# Altium footprint library Custom1.PcbLib: 554 footprints (part 34 of 35)
Each footprint in its own frame and in the unit in brackets; x right, y up, seen from the top. Pads: shape width x height; smd on the part's side, far side on the other; paste and mask are expansions set on the pad; w line width, h text height; cw(c..) or ccw(c..) is an arc to the next point about the centre after c.
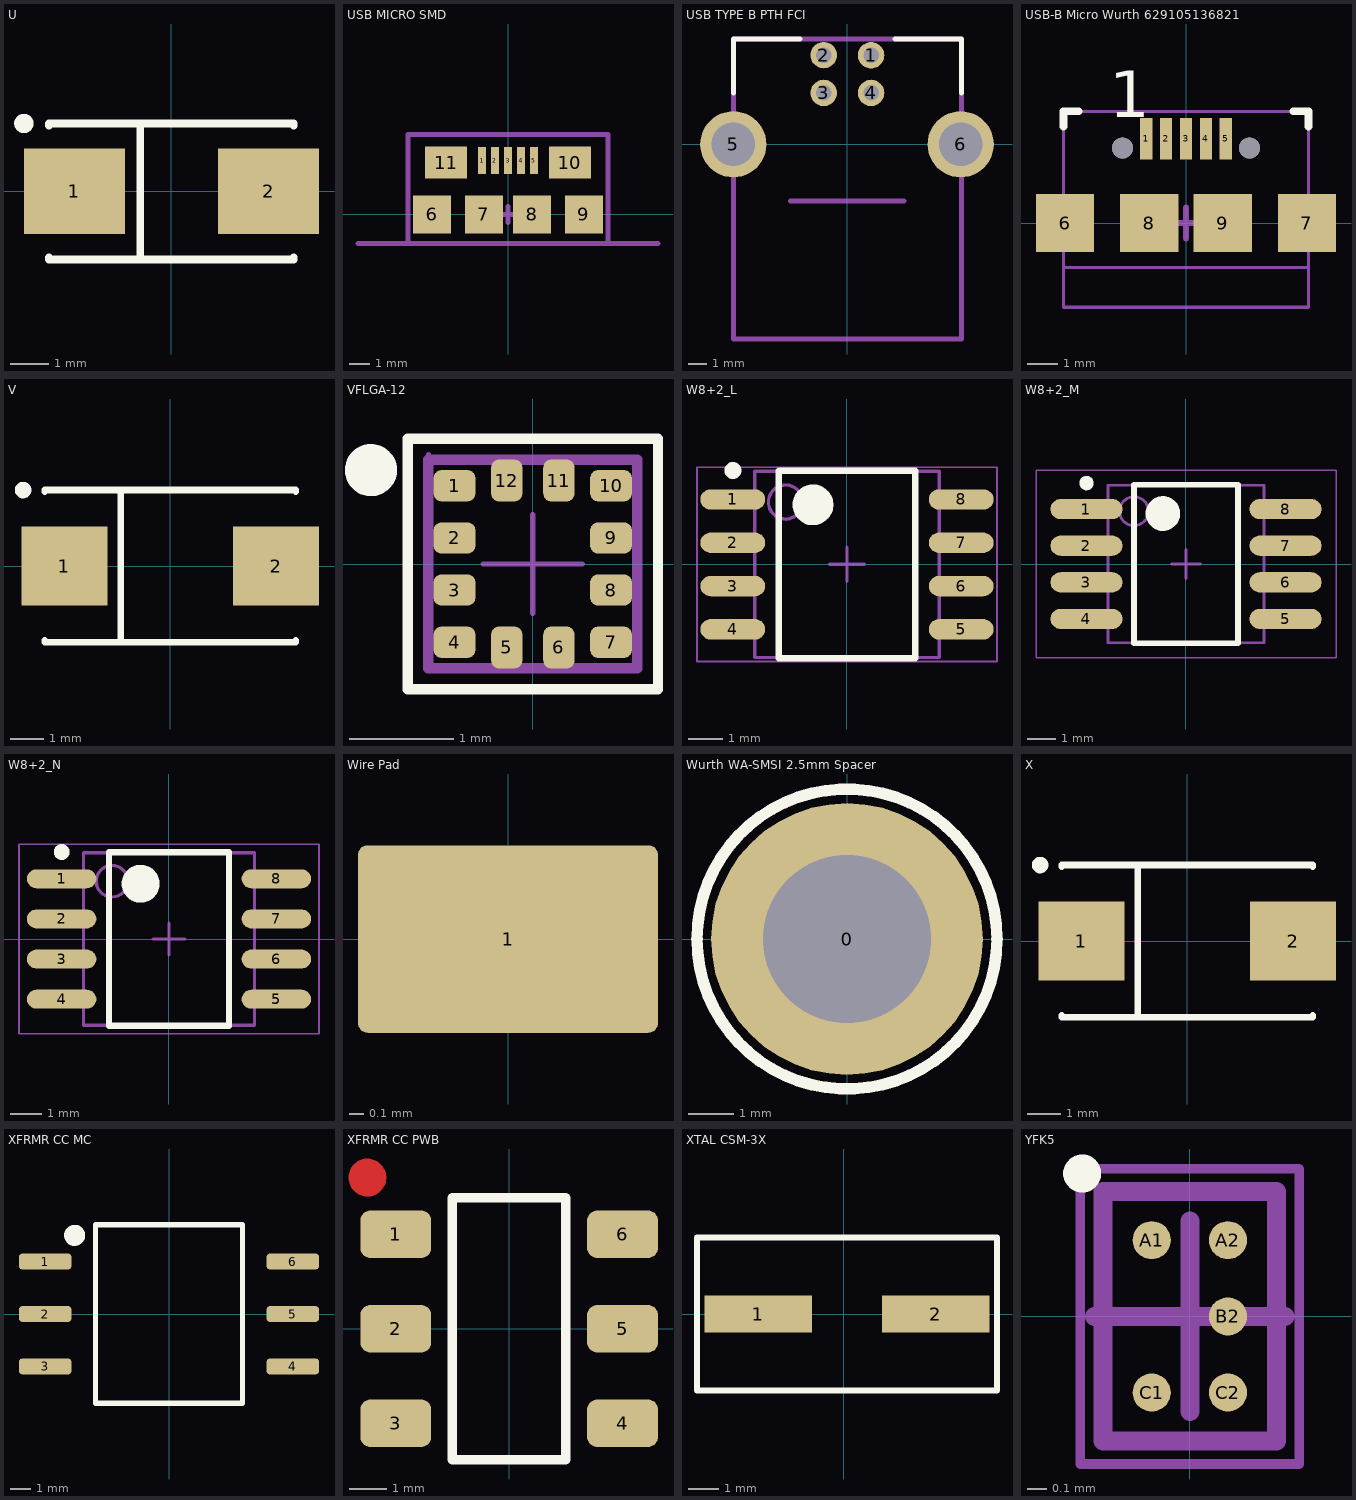
[diagram p33: the footprints below, top view; thin cyan lines are the x and y axes]

## U [mm] "Capacitor, SM Tantalum; Body 6.0 x 3.2 mm (LxW typ)"
height 1.5
pads (2):
  rect 2.6x2.2 smd: 1(-2.5,0) 2(2.5,0)
Top Overlay:
  circle w0.25: c-3.8,1.75 r0.125
  lines w0.2: -3.15,-1.7 -3.15,-1.75 3.15,-1.75 3.15,-1.7 ; -3.15,1.7 -3.15,1.75 3.15,1.75 3.15,1.7 ; -0.8,-1.75 -0.8,1.75

## USB MICRO SMD [mm]
pads (11):
  rect 0.4x1.35 smd: 1(-1.3,2.7) 2(-0.65,2.7) 3(0,2.7) 4(0.65,2.7) 5(1.3,2.7)
  rect 1.9x1.9 smd: 6(-3.8,0) 7(-1.2,0) 8(1.2,0) 9(3.8,0)
  rect 2.1x1.6 smd: 10(3.1,2.6) 11(-3.1,2.6)
Mechanical 15:
  lines w0.254: -7.5,-1.45 -3.2,-1.45 3.2,-1.45 7.5,-1.45 ; -5,-1.45 -5,4 5,4 5,-1.45 ; -0.4,0 0.4,0 ; 0,-0.4 0,0.4
3D body "10118192C.stp": height 2.69, standoff -0.32, extent -3.956,-2.7 3.956,2.96

## USB TYPE B PTH FCI [mm] "Type B USB Receptacle"
pads (6):
  round 1.4 hole 0.82: 1(1.25,4.7) 2(-1.25,4.71) 3(-1.25,2.71) 4(1.25,2.71)
  round 3.5 hole 2.3: 5(-6.02,0) 6(5.98,0)
Top Overlay:
  lines w0.254: -6.02,2.71 -6.02,5.56 -2.5,5.56 ; 2.5,5.56 6.02,5.56 6.02,2.71
Mechanical 15:
  lines w0.254: -3,-3 3,-3 ; -6.02,-10.28 -6.02,5.56 6.02,5.56 6.02,-10.28 -6.02,-10.28
3D body "USB Type B.STEP": height 11.01, standoff -2.78, extent -6.62,-10.17 6.5,5.77

## USB-B Micro Wurth 629105136821 [mm]
pads (11):
  rect 0.4x1.35 smd: 1(-1.3,2.75) 2(-0.65,2.75) 3(0,2.75) 4(0.65,2.75) 5(1.3,2.75)
  rect 1.9x1.9 smd: 6(-3.95,0) 7(3.95,0)
  rect 1.9x1.9 smd paste-1: 8(-1.2,0)
  rect 1.9x1.9 smd paste-1 mask+0.102: 9(1.2,0)
  round 0.69 hole 0.68 paste-0.1 mask+0: ""(-2.075,2.45) ""(2.075,2.45)
Top Overlay:
  lines w0.254: -4,3.15 -4,3.65 -3.5,3.65 ; 3.5,3.65 4,3.65 4,3.15
  text "1" at -2.5,3.45 h1.52
Mechanical 15:
  lines w0.1: -4,-1.45 4,-1.45 ; -4,-2.75 4,-2.75 4,3.65 -4,3.65 -4,-2.75
  lines w0.2: -0.5,0 0.5,0 ; 0,-0.5 0,0.5
  text "Overhang" at -2.7,-2.4 h0.7
3D body "629105136821.STEP": height 2.65, standoff -0.65, extent -4,-2.753 4,3.15

## V [mm] "Capacitor, SM Tantalum; Body 7.3 x 4.3 mm (LxW typ)"
height 2
pads (2):
  rect 2.6x2.4 smd: 1(-3.2,0) 2(3.2,0)
Top Overlay:
  circle w0.25: c-4.45,2.3 r0.125
  lines w0.2: -3.8,-2.25 -3.8,-2.3 3.8,-2.3 3.8,-2.25 ; -3.8,2.25 -3.8,2.3 3.8,2.3 3.8,2.25 ; -1.5,-2.3 -1.5,2.3

## VFLGA-12 [mm] "2.0 x 2.0 x 0.76 mm typ.)"
pads (12):
  rrect50% 0.4x0.3 smd mask+0.05: 1(-0.75,0.75) 2(-0.75,0.25) 3(-0.75,-0.25) 4(-0.75,-0.75) 7(0.75,-0.75) 8(0.75,-0.25) 9(0.75,0.25) 10(0.75,0.75)
  rrect50% 0.3x0.4 smd mask+0.05: 5(-0.25,-0.8) 6(0.25,-0.8) 11(0.25,0.8) 12(-0.25,0.8)
Top Overlay:
  circle w0.25: c-1.55,0.9 r0.125
  lines w0.1: -1.2,-1.2 1.2,-1.2 1.2,1.2 -1.2,1.2 -1.2,-1.2
Mechanical 13:
  lines w0.1: -1,-1 1,-1 1,1 -1,1 -1,-1
Mechanical 15:
  lines w0.05: -1,1 1,1 1,-1 -1,-1 -1,1.05 ; -0.475,0 0.475,0 ; 0,-0.475 0,0.475
3D body: height 1, standoff 0, extent -1.02,-1 0.98,1

## W8+2_L [mm] "SOP, 8-Leads, Body 5.3x5.3mm, Pitch 1.27mm, IPC High Density"
height 2.13
pads (8):
  oval 1.9x0.6 smd: 1(-3.35,1.905) 2(-3.35,0.635) 3(-3.35,-0.635) 4(-3.35,-1.905) 5(3.35,-1.905) 6(3.35,-0.635) 7(3.35,0.635) 8(3.35,1.905)
Top Overlay:
  circle w0.25: c-3.35,2.755 r0.125
  circle w0.6: c-1,1.75 r0.3
  lines w0.2: -2,-2.75 -2,2.75 2,2.75 2,-2.75 -2,-2.75
Mechanical 13:
  circle w0.1: c-1.805,1.83 r0.5
  lines w0.1: -2.705,-2.73 -2.705,2.73 2.705,2.73 2.705,-2.73 -2.705,-2.73
Mechanical 15:
  lines w0.05: -4.4,-2.85 -4.4,2.85 4.4,2.85 4.4,-2.85 -4.4,-2.85
  lines w0.1: -0.5,0 0.5,0 ; 0,-0.5 0,0.5
3D body: height 2.13, standoff 0.05, extent -2.705,-2.73 2.705,2.73

## W8+2_M [mm] "SOP, 8-Leads, Body 5.3x5.3mm, Pitch 1.27mm, IPC Low Density"
height 2.13
pads (8):
  oval 2.5x0.7 smd: 1(-3.45,1.905) 2(-3.45,0.635) 3(-3.45,-0.635) 4(-3.45,-1.905) 5(3.45,-1.905) 6(3.45,-0.635) 7(3.45,0.635) 8(3.45,1.905)
Top Overlay:
  circle w0.6: c-0.8,1.75 r0.3
  circle w0.25: c-3.45,2.805 r0.125
  lines w0.2: -1.8,-2.75 1.8,-2.75 1.8,2.75 -1.8,2.75 -1.8,-2.75
Mechanical 13:
  circle w0.1: c-1.805,1.83 r0.5
  lines w0.1: -2.705,-2.73 2.705,-2.73 2.705,2.73 -2.705,2.73 -2.705,-2.73
Mechanical 15:
  lines w0.05: -5.2,-3.25 5.2,-3.25 5.2,3.25 -5.2,3.25 -5.2,-3.25
  lines w0.1: -0.5,0 0.5,0 ; 0,-0.5 0,0.5
3D body: height 2.13, standoff 0.05, extent -2.705,-2.73 2.705,2.73

## W8+2_N [mm] "SOP, 8-Leads, Body 5.3x5.3mm, Pitch 1.27mm, IPC Medium Density"
height 2.13
pads (8):
  oval 2.2x0.6 smd: 1(-3.4,1.905) 2(-3.4,0.635) 3(-3.4,-0.635) 4(-3.4,-1.905) 5(3.4,-1.905) 6(3.4,-0.635) 7(3.4,0.635) 8(3.4,1.905)
Top Overlay:
  circle w0.25: c-3.4,2.755 r0.125
  circle w0.6: c-0.9,1.75 r0.3
  lines w0.2: -1.9,-2.75 -1.9,2.75 1.9,2.75 1.9,-2.75 -1.9,-2.75
Mechanical 13:
  circle w0.1: c-1.805,1.83 r0.5
  lines w0.1: -2.705,-2.73 -2.705,2.73 2.705,2.73 2.705,-2.73 -2.705,-2.73
Mechanical 15:
  lines w0.05: -4.75,-3 -4.75,3 4.75,3 4.75,-3 -4.75,-3
  lines w0.1: -0.5,0 0.5,0 ; 0,-0.5 0,0.5
3D body: height 2.13, standoff 0.05, extent -2.705,-2.73 2.705,2.73

## Wire Pad [mil] "50 x 80"
pads (1):
  rrect10% 80x50 smd: 1(0,0)
3D body: height 1, standoff 0, extent -75,-40 75,40

## Wurth WA-SMSI 2.5mm Spacer [mm] "9774065151"
pads (1):
  round 6 hole 3.7 paste-3: 0(0,0)
Top Overlay:
  circle w0.254: c0,0 r3.312
Top Paste:
  lines w0.85: -2.176,-1.23 cw(c0,0) -2.152,1.272 ; -1.323,-2.238 ccw(c0,0) 1.279,-2.263 ; -1.279,2.263 cw(c0,0) 1.323,2.238 ; -1.272,-2.152 ccw(c0,0) 1.23,-2.176 ; -1.23,2.176 cw(c0,0) 1.272,2.152 ; 2.152,-1.272 ccw(c0,0) 2.176,1.23 ; 2.238,-1.323 ccw(c0,0) 2.263,1.279
3D body "Keystone 4883.STEP": height 6.36, standoff -1.51, extent -2.781,-2.781 2.781,2.781

## X [mm] "Capacitor, SM Tantalum; Body 7.3 x 4.3 mm (LxW typ)"
height 4.3
pads (2):
  rect 2.6x2.4 smd: 1(-3.2,0) 2(3.2,0)
Top Overlay:
  circle w0.25: c-4.45,2.3 r0.125
  lines w0.2: -3.8,-2.25 -3.8,-2.3 3.8,-2.3 3.8,-2.25 ; -3.8,2.25 -3.8,2.3 3.8,2.3 3.8,2.25 ; -1.5,-2.3 -1.5,2.3

## XFRMR CC MC [mil]
height 225
pads (6):
  rrect40% 100x30 smd: 1(-236,100) 2(-236,0) 3(-236,-100) 4(236,-100) 5(236,0) 6(236,100)
Top Overlay:
  circle w20: c-180,150 r10
  lines w10: -140,-170 140,-170 140,170 -140,170 -140,-170
3D body: height 225, standoff 25, extent -140,-170 140,170

## XFRMR CC PWB [mil]
height 225
pads (6):
  rrect40% 75x50 smd: 1(-120,100) 2(-120,0) 3(-120,-100) 4(120,-100) 5(120,0) 6(120,100)
Top Layer:
  circle w20: c-150,160 r10
Top Overlay:
  lines w10: -60.04,-138.78 -60.04,138.78 60.04,138.78 60.04,-138.78 -60.04,-138.78
3D body: height 175, standoff 25, extent -130,-130 130,130

## XTAL CSM-3X [mm]
pads (2):
  rect 3.5x1.2 smd: 1(-2.8,0) 2(3,0)
Top Overlay:
  lines w0.2: -4.8,-2.5 -4.8,-1.25 -4.8,1.25 -4.8,2.5 5,2.5 5,-2.5 -4.8,-2.5

## YFK5 [mm] "BGA, 5-Leads, Body 1.31x0.91mm, Pitch 0.4mm"
height 0.63
pads (5):
  round 0.2 smd: A1(-0.2,0.4) A2(0.2,0.4) B2(0.2,0) C1(-0.2,-0.4) C2(0.2,-0.4)
Top Overlay:
  circle w0.1: c-0.565,0.75 r0.05
Mechanical 13:
  lines w0.1: -0.455,-0.655 -0.455,0.655 0.455,0.655 0.455,-0.655 -0.455,-0.655
Mechanical 15:
  lines w0.05: -0.575,-0.775 -0.575,0.775 0.575,0.775 0.575,-0.775 -0.575,-0.775
  lines w0.1: -0.5,0 0.5,0 ; 0,-0.5 0,0.5
3D body: height 0.63, standoff 0.12, extent -0.455,-0.655 0.455,0.655